# Altium footprint library TO系列封装.PcbLib: 129 footprints (part 4 of 9)
Each footprint in its own frame and in the unit in brackets; x right, y up, seen from the top. Pads: shape width x height; smd on the part's side, far side on the other; paste and mask are expansions set on the pad; w line width, h text height; cw(c..) or ccw(c..) is an arc to the next point about the centre after c.
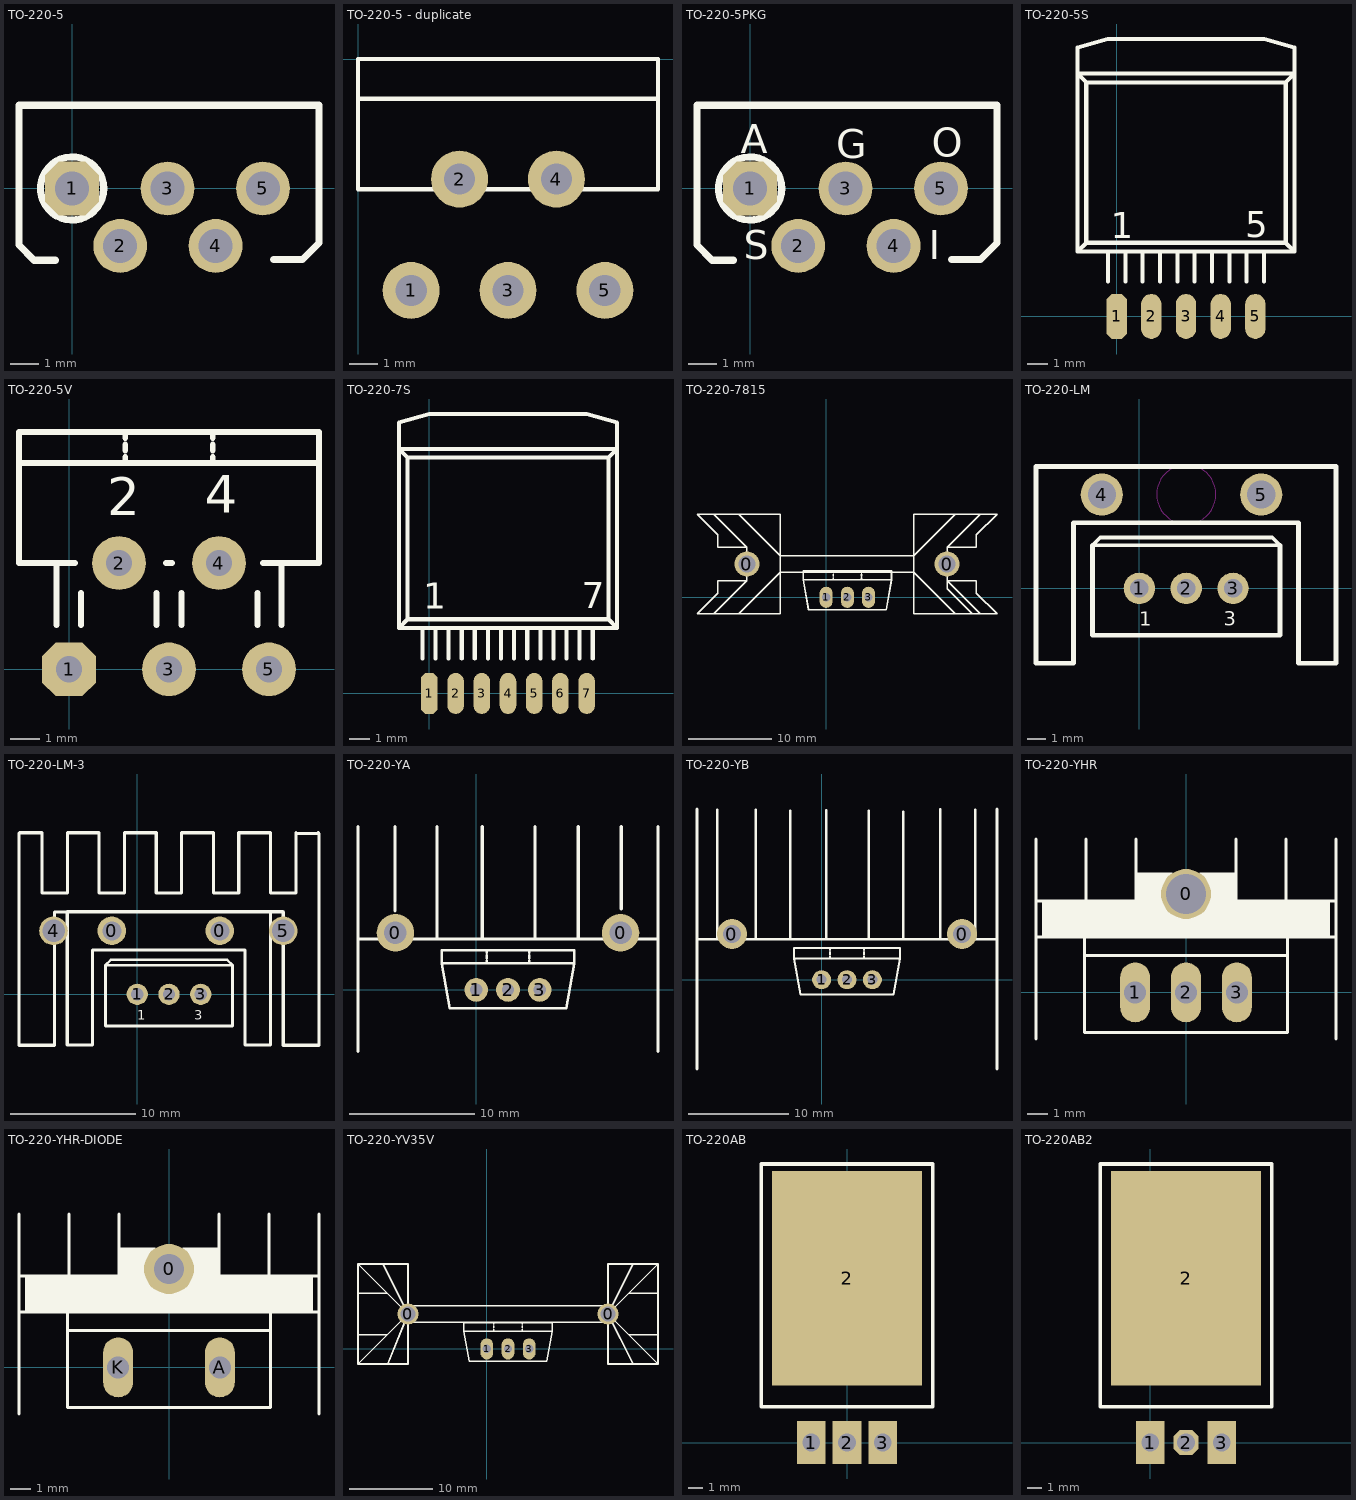
[diagram p3: the footprints below, top view; thin cyan lines are the x and y axes]

## TO-220-5 [mil]
pads (5):
  oct 75x75 hole 47.24: 1(0,0)
  round 75 hole 47.24: 2(67,-80) 3(133,0) 4(200,-80) 5(266,0)
Top Overlay:
  circle w10: c0,0 r44
  lines w10: -23,-100 -53,-100 -74.02,-78.98 -74.02,52.76 -74.02,116 344.09,116 344.09,56.38 344.09,-75.91 320.91,-99.09 280.91,-99.09
3D body "TO220-5.STEP": height 761.81, standoff -89.06, extent -66.14,-82.69 333.86,110.24

## TO-220-5 - duplicate [mm]
pads (5):
  round 2 hole 1.1: 1(1.867,-8.128) 2(3.569,-4.216) 3(5.271,-8.128) 4(6.972,-4.216) 5(8.674,-8.128)
Top Overlay:
  lines w0.15: 0,-1.397 10.541,-1.397 ; 0,-4.572 10.541,-4.572 10.541,0 0,0 0,-4.572
3D body "SW3dPS-TO220-51.STEP": height 21.35, standoff -2.64, extent 0.191,-8.165 10.351,0.075

## TO-220-5PKG [mil]
pads (5):
  oct 75x75 hole 47.24: 1(0,0)
  round 75 hole 47.24: 2(67,-80) 3(133,0) 4(200,-80) 5(266,0)
Top Overlay:
  circle w10: c0,0 r44
  lines w10: -23,-100 -53,-100 -74.02,-78.98 -74.02,52.76 -74.02,116 344.09,116 344.09,56.38 344.09,-75.91 320.91,-99.09 280.91,-99.09
  text "O" at 253,44 h40
  text "G" at 120,42 h40
  text "I" at 249,-99 h40
  text "S" at -9,-99 h40
  text "A" at -13,49 h40
3D body "TO220-5.STEP": height 761.81, standoff -89.06, extent -66.14,-82.69 333.86,110.24

## TO-220-5S [mil]
pads (5):
  oct 39.17x86.67 smd: 1(0,0)
  oval 39.17x86.67 smd: 2(66.67,0) 3(133.33,0) 4(200,0) 5(266.67,0)
Top Overlay:
  lines w7.87: -16.67,66.93 -16.67,125 ; 16.67,66.93 16.67,125 ; 50,66.93 50,125 ; 83.33,66.93 83.33,125 ; 116.67,66.93 116.67,125 ; 150,66.93 150,125 ; 183.33,66.93 183.33,125 ; 216.67,66.93 216.67,125 ; 250,66.93 250,125 ; 283.33,66.93 283.33,125 ; -75,125 341.67,125 ; -75,125 -75,466.67 ; -75,125 -58.33,141.67 ; -75,466.67 341.67,466.67 ; -75,466.67 -75,516.67 -16.67,533.33 283.33,533.33 341.67,516.67 341.67,466.67 ; -75,466.67 -58.33,450 ; -58.33,141.67 -58.33,450 ; -58.33,141.67 325,141.67 ; -58.33,450 325,450 ; 325,141.67 325,450 ; 325,141.67 341.67,125 ; 325,450 341.67,466.67 ; 341.67,125 341.67,466.67
  text "1" at -11.1,150.8 h50
  text "5" at 247.1,151.89 h50

## TO-220-5V [mil]
pads (5):
  oct 71.67x71.67 hole 35: 1(0,0)
  round 71.67 hole 35: 2(66.67,141.67) 3(133.33,0) 4(200,141.67) 5(266.67,0)
Top Overlay:
  lines w7.87: -66.67,275 333.33,275 ; -16.67,59.05 -16.67,141.67 ; 7.87,141.67 -66.67,141.67 -66.67,316.67 333.33,316.67 333.33,141.67 258.79,141.67 ; 15.75,59.05 15.75,101.5 ; 75,275 75,283.33 ; 75,291.67 75,300 ; 75,308.33 75,316.67 ; 116.67,59.05 116.67,101.5 ; 129.4,141.67 137.27,141.67 ; 150,59.05 150,101.5 ; 191.67,275 191.67,283.33 ; 191.67,291.67 191.67,300 ; 191.67,308.33 191.67,316.67 ; 251.21,59.05 251.21,101.5 ; 283.33,59.05 283.33,141.67
  text "4" at 180.98,208.71 h50
  text "2" at 51.22,205.36 h50

## TO-220-7S [mil]
pads (7):
  oct 31.67x78.33 smd: 1(0,0)
  oval 31.67x78.33 smd: 2(50,0) 3(100,0) 4(150,0) 5(200,0) 6(250,0) 7(300,0)
Top Overlay:
  lines w7.87: -13.33,66.93 -13.33,125 ; 11.67,66.93 11.67,125 ; 36.67,66.93 36.67,125 ; 61.67,66.93 61.67,125 ; 86.67,66.93 86.67,125 ; 111.67,66.93 111.67,125 ; 136.67,66.93 136.67,125 ; 161.67,66.93 161.67,125 ; 186.67,66.93 186.67,125 ; 211.67,66.93 211.67,125 ; 236.67,66.93 236.67,125 ; 261.67,66.93 261.67,125 ; 286.67,66.93 286.67,125 ; 311.67,66.93 311.67,125 ; -58.33,125 358.33,125 ; -58.33,125 -58.33,466.67 ; -58.33,125 -41.67,141.67 ; -58.33,466.67 358.33,466.67 ; -58.33,466.67 -58.33,516.67 0,533.33 300,533.33 358.33,516.67 358.33,466.67 ; -58.33,466.67 -41.67,450 ; -41.67,141.67 -41.67,450 ; -41.67,141.67 341.67,141.67 ; -41.67,450 341.67,450 ; 341.67,141.67 341.67,450 ; 341.67,141.67 358.33,125 ; 341.67,450 358.33,466.67 ; 358.33,125 358.33,466.67
  text "1" at -11.5,161.9 h50
  text "7" at 290.27,162.98 h50

## TO-220-7815 [mm]
pads (5):
  round 3 hole 2: 0(-9.5,4) 0(14.5,4)
  oval 1.575x2.54 hole 1.016: 1(0,0) 2(2.54,0) 3(5.08,0)
Top Overlay:
  lines w0.15: -13.5,-2 -9.5,2 ; -13.5,10 -9.5,6 ; -10.5,-2 -5.5,3 ; -10.5,10 -5.5,5 ; 15.5,-2 10.5,3 ; 17.5,-2 14.5,1 14.5,2 ; 18.5,-2 14.5,2 ; 18.5,10 14.5,6 ; -9.5,2 -9.5,6 ; -9.5,2 -13,2 -13,0.5 -15.5,-2 -15,-2 -5.5,-2 -5.5,5 ; -9.5,6 -13,6 -13,7.5 -15.5,10 -15,10 -5.5,10 -5.5,5 ; -5.5,3 10.5,3 ; -5.5,3 -5.5,5 ; -5.5,5 10.5,5 ; 10.5,3 10.5,5 ; 10.5,5 15.5,10 ; 10.5,5 15.5,10 ; 14.5,2 14.5,6 ; 14.5,2 18,2 18,0.5 20.5,-2 10.5,-2 10.5,10 20.5,10 ; 14.5,6 18,6 18,7.5 20.5,10 ; 15.5,10 20.5,10
  lines w0.2: 0.847,2.117 0.847,2.328 ; 0.847,2.54 0.847,2.752 ; 0.847,2.963 0.847,3.175 ; 4.233,2.117 4.233,2.328 ; 4.233,2.54 4.233,2.752 ; 4.233,2.963 4.233,3.175 ; -2.752,2.117 7.832,2.117 ; -2.752,2.117 -2.117,-1.482 7.197,-1.482 7.832,2.117 ; -2.752,2.117 -2.752,3.175 7.832,3.175 7.832,2.117
3D body "User Library-TO220-AB PCB.STEP": height 22.05, standoff -1.5, extent -2.28,-1.778 7.62,2.679
3D body "User Library-Heat Sink 657-20ABP(Wakefield).STEP": height 50.8, standoff -3.96, extent -18.482,-9.017 23.368,16.383

## TO-220-LM [mm]
pads (5):
  round 1.7 hole 1: 1(0,0) 2(2.54,0) 3(5.08,0)
  round 2.286 hole 1.524: 4(-2.032,5.08) 5(6.604,5.08)
Top Overlay:
  lines w0.2: -2.54,2.328 7.62,2.328 7.197,2.752 -2.117,2.752 -2.54,2.328
  lines w0.254: -2.54,2.328 -2.54,-2.529 -2.529,-2.54 7.609,-2.54 7.62,-2.529 7.62,2.328 ; 10.657,3.556 10.657,6.604 ; 10.657,6.604 10.657,-4.064 8.625,-4.064 8.625,3.556 -3.567,3.556 -3.567,-4.064 -5.599,-4.064 -5.599,1.016 -5.599,3.556 -5.599,6.604 10.657,6.604
  text "3" at 4.572,-2.032 h0.76
  text "1" at 0,-2.032 h0.76
Keep-Out Layer:
  circle w0.025: c2.545,5.094 r1.606
3D body "User Library-Package T0-220AB With Heatsing Vertical Mount-1.STEP": height 21.07, standoff -4.86, extent -5.96,-5.775 11.04,4.445

## TO-220-LM-3 [mil]
pads (7):
  round 90 hole 60: 0(-80,200) 0(260,200)
  round 66.93 hole 39.37: 1(0,0) 2(100,0) 3(200,0)
  round 90 hole 70.87: 4(-263.72,199.65) 5(459.82,199.65)
Top Overlay:
  lines w7.87: -100,91.67 -83.33,108.33 283.33,108.33 300,91.67 -100,91.67
  lines w10: -372.44,379.39 -372.44,507.14 ; -372.44,391.91 -372.44,507.14 ; -100,91.67 -100,-99.56 -99.56,-100 299.56,-100 300,-99.56 300,91.67 ; 419.56,140 419.56,260 ; 459.82,119.65 459.82,199.65 ; 570.28,508.93 572.44,506.77 ; 572.44,387.75 572.44,506.77 ; -372.44,507.14 -372.44,-160.61 -260.18,-160.61 -260.18,259.65 -220.78,259.65 -220.44,260 ; -372.44,507.14 -370.65,508.93 -300.18,508.93 -300.18,319.39 -220.18,319.39 -220.18,508.93 -120.18,508.93 -120.18,319.39 -40.18,319.39 -40.18,508.93 59.82,508.93 59.82,319.39 139.82,319.39 139.82,508.93 239.82,508.93 239.82,319.39 319.82,319.39 319.82,508.93 399.82,508.93 419.82,508.93 419.82,319.39 499.82,319.39 499.82,508.93 501.97,506.77 572.44,506.77 ; -220.44,260 419.56,260 ; -220.44,260 -220.44,140 -220.44,40 -220.44,-160 -140.44,-160 -140.44,140 339.56,140 339.56,-160 419.56,-160 419.56,260 ; 419.56,260 459.47,260 459.82,259.65 459.82,-160.61 572.44,-160.61 572.44,506.77
  text "1" at 0,-80 h30
  text "3" at 180,-80 h30
3D body "User Library-TO220-AB PCB.STEP": height 789.37, standoff -137.8, extent -94.88,-66.02 294.88,109.47
3D body: height 1377.95, standoff 19.68, extent -375,-165 570,510
3D body: height 1377.95, standoff 19.68, extent -265,110 490,280

## TO-220-YA [mm]
pads (5):
  round 3 hole 1.8: 0(-6.46,4.564) 0(11.54,4.564)
  round 1.9 hole 1: 1(0,0) 2(2.54,0) 3(5.08,0)
Top Overlay:
  lines w0.2: 0.847,2.117 0.847,2.328 ; 0.847,2.54 0.847,2.752 ; 0.847,2.963 0.847,3.175 ; 4.233,2.117 4.233,2.328 ; 4.233,2.54 4.233,2.752 ; 4.233,2.963 4.233,3.175 ; -2.752,2.117 -2.752,3.175 7.832,3.175 7.832,2.117 ; -2.752,2.117 -2.117,-1.482 7.197,-1.482 7.832,2.117 ; -2.752,2.117 7.832,2.117
  lines w0.254: -9.46,-4.929 -9.46,13.071 ; -9.46,4.064 14.54,4.064 ; -6.488,6.33 -6.488,13.071 ; -3.138,4.208 -3.138,13.071 ; 0.48,4.064 0.48,13.071 ; 4.701,4.099 4.701,13.071 ; 8.155,4.208 8.155,13.071 ; 11.601,6.473 11.601,13.071 ; 14.54,-4.929 14.54,13.071
3D body: height 35, standoff 0.5, extent -10.414,-4.953 14.605,13.081
3D body "User Library-TO220-AB PCB.STEP": height 20.05, standoff -3.5, extent -2.41,-1.296 7.49,3.161

## TO-220-YB [mm]
pads (5):
  round 3 hole 1.8: 0(-8.96,4.564) 0(14.04,4.564)
  round 1.9 hole 1: 1(0,0) 2(2.54,0) 3(5.08,0)
Top Overlay:
  lines w0.2: 0.847,2.117 0.847,2.328 ; 0.847,2.54 0.847,2.752 ; 0.847,2.963 0.847,3.175 ; 4.233,2.117 4.233,2.328 ; 4.233,2.54 4.233,2.752 ; 4.233,2.963 4.233,3.175 ; -2.752,2.117 7.832,2.117 ; -2.752,2.117 -2.117,-1.482 7.197,-1.482 7.832,2.117 ; -2.752,2.117 -2.752,3.175 7.832,3.175 7.832,2.117
  lines w0.254: -12.46,-8.929 -12.46,17.071 ; -12.46,4.064 17.54,4.064 ; -10.429,4.263 -10.429,16.982 ; -6.592,4.064 -6.592,16.981 ; -3.138,4.208 -3.138,16.873 ; 0.48,4.064 0.48,16.926 ; 4.701,4.099 4.701,16.872 ; 8.155,4.208 8.155,16.816 ; 11.882,4.208 11.882,17.036 ; 15.364,4.064 15.364,17.009 ; 17.54,-8.929 17.54,17.071
3D body "User Library-TO220-AB PCB.STEP": height 20.05, standoff -3.5, extent -2.537,-1.423 7.363,3.034
3D body: height 35, standoff 0.5, extent -12.446,-9.017 17.907,17.018

## TO-220-YHR [mm]
pads (4):
  round 2.5 hole 2: 0(0,4.917)
  oval 1.5x3 hole 1.1: 1(-2.54,0) 2(0,0) 3(2.54,0)
Top Overlay:
  rectangle: -7.195,2.767 7.207,4.567
  rectangle: -2.5,4.039 -0.667,5.994
  region: 2.5,5.994 0.667,5.994 0.667,4.039 2.5,4.039
  lines w0.15: -7.5,-2.333 -7.5,7.667 ; -7.5,2.767 7.5,2.767 ; -7.5,4.567 7.5,4.567 ; -5.08,1.848 5.08,1.848 ; -5,4.567 -5,7.667 ; -2.5,4.567 -2.5,7.667 ; 2.5,4.567 2.5,7.667 ; 5,4.567 5,7.667 ; 7.5,-2.333 7.5,7.667 ; -5.08,-2 5.08,-2 5.08,2.79 -5.08,2.79 -5.08,-2
3D body "User Library-TO220-AB PCB.STEP": height 20.05, standoff -3.5, extent -4.95,-2.439 4.95,2.018
3D body "User Library-heatsink TO126.step": height 25, standoff -3.8, extent -8.153,-1.784 6.629,9.017

## TO-220-YHR-DIODE [mm]
pads (3):
  round 2.5 hole 1.5: 0(0,4.917)
  oval 1.5x3 hole 1.1: A(2.54,0) K(-2.54,0)
Top Overlay:
  region: 2.5,5.994 0.667,5.994 0.667,4.039 2.5,4.039
  rectangle: -2.5,4.039 -0.667,5.994
  rectangle: -7.195,2.767 7.207,4.567
  lines w0.15: -7.5,-2.333 -7.5,7.667 ; -7.5,2.767 7.5,2.767 ; -7.5,4.567 7.5,4.567 ; -5.08,1.848 5.08,1.848 ; -5,4.567 -5,7.667 ; -2.5,4.567 -2.5,7.667 ; 2.5,4.567 2.5,7.667 ; 5,4.567 5,7.667 ; 7.5,-2.333 7.5,7.667 ; -5.08,-2 5.08,-2 5.08,2.79 -5.08,2.79 -5.08,-2
3D body "User Library-heatsink TO126.step": height 25, standoff -3.8, extent -7.391,-2.578 7.391,8.223

## TO-220-YV35V [mil]
pads (5):
  round 100 hole 70: 0(-372.44,165) 0(572.44,165)
  oval 60x100 hole 40: 1(0,0) 2(100,0) 3(200,0)
Top Overlay:
  lines w7.87: 33.33,83.33 33.33,91.67 ; 33.33,100 33.33,108.33 ; 33.33,116.67 33.33,125 ; 166.67,83.33 166.67,91.67 ; 166.67,100 166.67,108.33 ; 166.67,116.67 166.67,125 ; -108.33,83.33 -108.33,125 308.33,125 308.33,83.33 ; -108.33,83.33 -83.33,-58.33 283.33,-58.33 308.33,83.33 ; -108.33,83.33 308.33,83.33
  lines w8: -608.66,67 -471.56,67 ; -608.56,263.43 -470.56,263.43 ; -490.55,401.22 -372.44,165 ; -467.56,-71.22 -372.44,165 ; -372.44,125.63 572.44,125.63 ; -372.44,204.37 572.44,204.37 ; 670.87,263.43 808.66,263.43 ; 671.87,67 808.66,67 ; 690.55,401.22 572.44,165 ; 692.44,-71.22 572.44,165 ; -608.66,-71.22 -608.66,401.22 ; -608.66,-71.22 -372.44,165 ; -608.66,-71.22 -372.44,-71.22 -372.44,401.22 -608.66,401.22 ; -608.66,401.22 -372.44,165 ; 572.44,165 808.66,401.22 ; 572.44,165 808.66,-71.22 ; 808.66,-71.22 808.66,401.22 ; 808.66,-71.22 572.44,-71.22 572.44,401.22 808.66,401.22
3D body "User Library-TO220-AB PCB.STEP": height 789.37, standoff -137.8, extent -99.88,-46.02 289.88,129.47
3D body: height 1968.5, standoff 19.68, extent -605,-70 805,400
3D body: height 728.23, standoff 610.35, extent 40,-67.48 157.65,247.48

## TO-220AB [mil]
pads (4):
  rect 80x120 hole 50: 1(-100,0) 2(0,0) 3(100,0)
  rect 420x600 smd: 2(0,460)
Top Overlay:
  lines w10: -240,100 240,100 240,780 -240,780 -240,100
3D body "User Library-TO220 L.STEP": height 177.17, standoff -118.11, extent -195,-27.88 198.7,747.88

## TO-220AB2 [mil]
pads (4):
  rect 80x120 hole 50: 1(0,0) 3(200,0)
  oct 70x70 hole 50: 2(100,0)
  rect 420x600 smd: 2(100,460)
Top Overlay:
  lines w10: -140,100 -140,780 340,780 340,100 -140,100
3D body "User Library-TO220 L.STEP": height 177.17, standoff -118.11, extent -101.85,-5 291.85,770.76